# Altium integrated library Cap-Cer-SMD_V2.IntLib: 957 symbols (part 5 of 7) (continued)
## 68uF_1206N_10V_20%_X7R
designator C?, comment value 68uF  Voltage: 10V  Text1: 1206  (hidden comment: 68uF_C1206_10V_20%_X7R)
Cap Ceramic X7R; Manufacturer: Various; Part Number: 68uF 1206 10V 20% X7R; Tol: 20%; Package: CAPC1206X135N; EDM-PN: *; Text2: *; SAAB PN: *; DCE Part No: *
footprint CAPC1206X135N (Chip Capacitor, 1206, 2-Leads, Body 3.2x1.6mm, IPC Medium Density)
pins: 1, 2

## 75pF_0402N_50V_5%_C0G/NP0
designator C?, comment value 75pF  Voltage: 50V  Text1: 0402  (hidden comment: 75pF_C0402_50V_5%_C0G/NP0)
Cap Ceramic C0G/NP0; Manufacturer: Various; Part Number: 75pF 0402 50V 5% C0G/NP0; Tol: 5%; Package: CAPC0402X60N; EDM-PN: *; Text2: *; SAAB PN: *; DCE Part No: *
footprint CAPC0402X60N (Chip Capacitor, 0402, 2-Leads, Body 1.0x0.5mm, IPC Medium Density)
pins: 1, 2

## 82pF_0603N_50V_5%_C0G/NP0
designator C?, comment value 82pF  Voltage: 50V  Text1: 0603  (hidden comment: 82pF_C0603_50V_5%_C0G/NP0)
Cap Ceramic C0G/NP0; Manufacturer: Various; Part Number: 82pF 0603 50V 5% C0G/NP0; Tol: 5%; Package: CAPC0603X85N; EDM-PN: *; Text2: *; SAAB PN: *; DCE Part No: *
footprint CAPC0603X85N (Chip Capacitor, 0603, 2-Leads, Body 1.6x0.8mm, IPC Medium Density)
pins: 1, 2

## 82pF_0805N_50V_5%_C0G/NP0
designator C?, comment value 82pF  Voltage: 50V  Text1: 0805  (hidden comment: 82pF_C0805_50V_5%_C0G/NP0)
Cap Ceramic C0G/NP0; Manufacturer: Various; Part Number: 82pF 0805 50V 5% C0G/NP0; Tol: 5%; Package: CAPC0805X110N; EDM-PN: *; Text2: *; SAAB PN: *; DCE Part No: *
footprint CAPC0805X110N (Chip Capacitor, 0805, 2-Leads, Body 2.0x1.3mm, IPC Medium Density)
pins: 1, 2

## 82pF_1111N_500V_5%_P90
designator C?, comment value 82pF  Voltage: 500V  Text1: 1111  (hidden comment: 100B820JT500XT)
Cap Ceramic P90; Manufacturer: ATC; Tol: 5%; Part Number: 100B820JT500XT; Package: CAPC1111-100B-T; EDM-PN: *; Text2: *; SAAB PN: *; DCE Part No: *
footprint CAPC1111-100B-T (Capacitor, 1111 2.79x2.79mm)
pins: 1, 2

## 100nF_0201N_6.3V_10%_X5R
designator C?, comment value 100nF  Voltage: 6.3V  Text1: 0201  (hidden comment: 100nF_C0201_6.3V_10%_X5R)
Cap Ceramic X5R; Manufacturer: Various; Part Number: 100nF 0201 6.3V 10% X5R; Tol: 10%; Package: CAPC0201X33N; EDM-PN: *; Text2: *; SAAB PN: *; DCE Part No: *
footprint CAPC0201X33N (Chip Capacitor, 0201, 2-Leads, Body 0.6x0.3mm, IPC Medium Density)
pins: 1, 2

## 100nF_0201N_10V_10%_X5R
designator C?, comment value 100nF  Voltage: 10V  Text1: 0201  (hidden comment: 100nF_C0201_10V_10%_X5R)
Cap Ceramic X5R; Manufacturer: Various; Part Number: 100nF 0201 10V 10% X5R; Tol: 10%; Package: CAPC0201X33N; EDM-PN: *; Text2: *; SAAB PN: *; DCE Part No: *
footprint CAPC0201X33N (Chip Capacitor, 0201, 2-Leads, Body 0.6x0.3mm, IPC Medium Density)
pins: 1, 2

## 100nF_0201N_10V_10%_X7R
designator C?, comment value 100nF  Voltage: 10V  Text1: 0201  (hidden comment: 100nF_C0201_10V_10%_X7R)
Cap Ceramic X7R; Manufacturer: Various; Part Number: 100nF 0201 10V 10% X7R; Tol: 10%; Package: CAPC0201X33N; EDM-PN: *; Text2: *; SAAB PN: *; DCE Part No: *
footprint CAPC0201X33N (Chip Capacitor, 0201, 2-Leads, Body 0.6x0.3mm, IPC Medium Density)
pins: 1, 2

## 100nF_0201N_10V_20%_X5R
designator C?, comment value 100nF  Voltage: 10V  Text1: 0201  (hidden comment: 100nF_C0201_10V_20%_X5R)
Cap Ceramic X5R; Manufacturer: Various; Part Number: 100nF 0201 10V 20% X5R; Tol: 20%; Package: CAPC0201X33N; EDM-PN: *; Text2: *; SAAB PN: *; DCE Part No: *
footprint CAPC0201X33N (Chip Capacitor, 0201, 2-Leads, Body 0.6x0.3mm, IPC Medium Density)
pins: 1, 2

## 100nF_0204N_6.3V_20%_X7S
designator C?, comment value 100nF  Voltage: 6.3V  Text1: 0204  (hidden comment: 100nF_C0204_6.3V_20%_X7S)
Cap Ceramic X7S LGA Low Inductance; Manufacturer: AVX; Part Number: LG126Z104MAT2S1; Tol: 20%; Reutech PN: 5910-CC-0401; Package: CAPC0204-0.5; EDM-PN: *; Text2: *; SAAB PN: *; DCE Part No: *
footprint CAPC0204-0.5 (C0204 0.5x1.0mm)
pins: 1, 2

## 100nF_0402L_10V_10%_X7R
designator C?, comment value 100nF  Voltage: 10V  Text1: 0402  (hidden comment: 100nF_C0402_10V_10%_X7R)
Cap Ceramic X7R; Manufacturer: Various; Part Number: 100nF 0402 10V 10% X7R; Tol: 10%; Package: CAPC0402X60L; EDM-PN: *; Text2: *; SAAB PN: *; DCE Part No: *
footprint CAPC0402X60L (Chip Capacitor, 0402, 2-Leads, Body 1.0x0.5mm, IPC High Density)
pins: 1, 2

## 100nF_0402L_16V_10%_X7R
designator C?, comment value 100nF  Voltage: 16V  Text1: 0402  (hidden comment: 100nF_C0402_16V_10%_X7R)
Cap Ceramic X7R; Manufacturer: Various; Part Number: 100nF 0402 16V 10% X7R; EDM-PN: CAP496; Tol: 10%; Package: CAPC0402X60L; Text2: *; SAAB PN: *; DCE Part No: *
footprint CAPC0402X60L (Chip Capacitor, 0402, 2-Leads, Body 1.0x0.5mm, IPC High Density)
pins: 1, 2

## 100nF_0402L_16V_10%_X7R-DNF
designator C?, comment value (100nF)  Voltage: 16V  Text1: 0402  (hidden comment: 100nF_C0402_16V_10%_X7R-DNF)
Cap Ceramic X7R - Do not Fit; Manufacturer: Various; Part Number: DNF - 100nF 0402 16V 10% X7R; Tol: 10%; Package: CAPC0402X60L; EDM-PN: *; Text2: *; SAAB PN: *; DCE Part No: *
footprint CAPC0402X60L (Chip Capacitor, 0402, 2-Leads, Body 1.0x0.5mm, IPC High Density)
pins: 1, 2

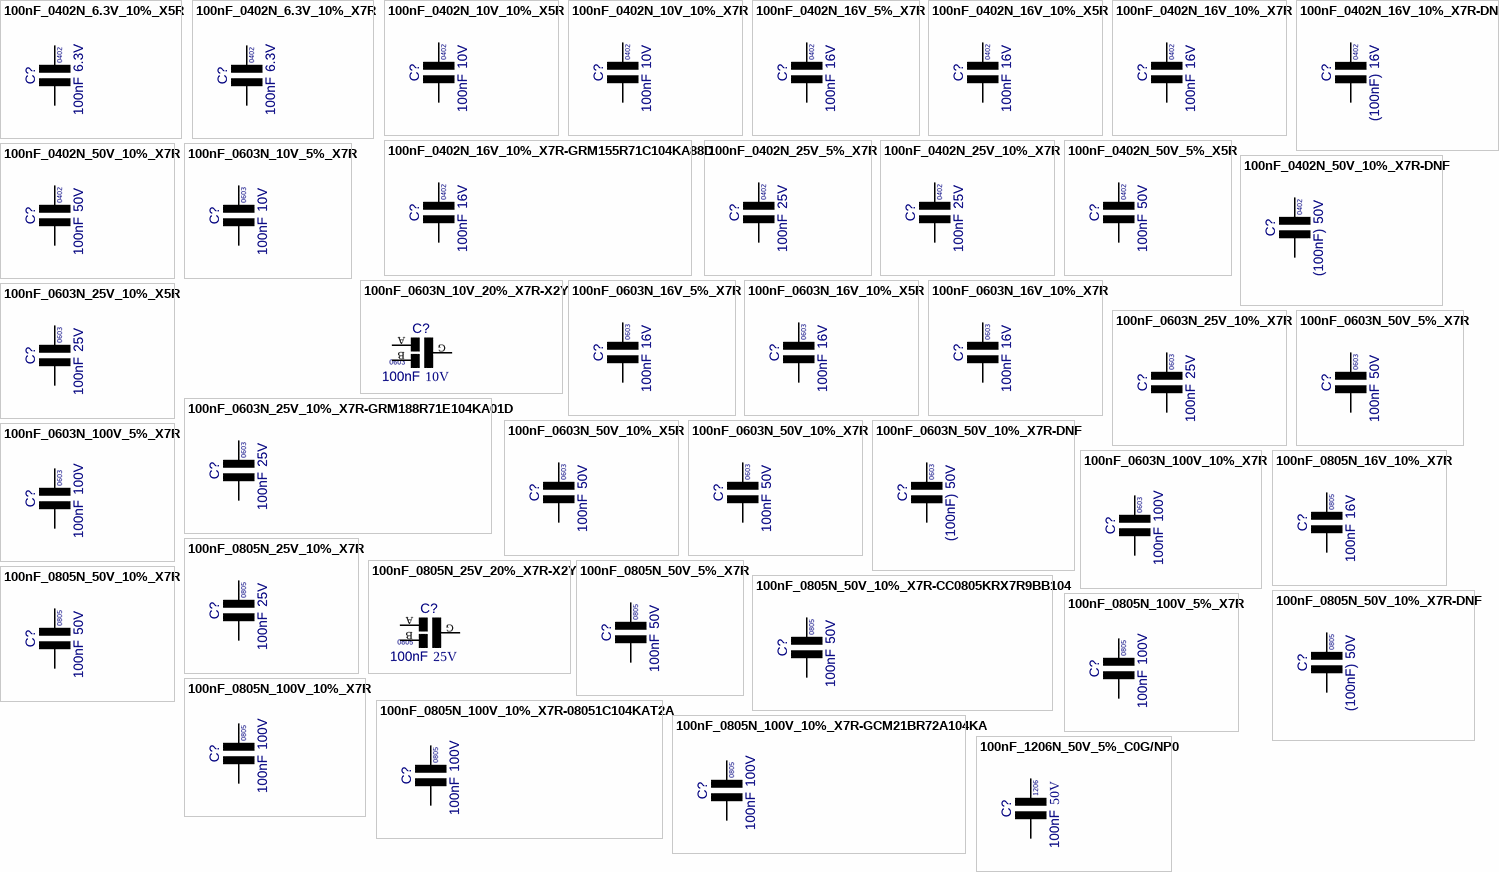
[diagram p17: symbols 100nF_0402N_6.3V_10%_X5R to 100nF_1206N_50V_5%_C0G/NP0]

## 100nF_0402N_6.3V_10%_X5R
designator C?, comment value 100nF  Voltage: 6.3V  Text1: 0402  (hidden comment: 100nF_C0402_6.3V_10%_X75R)
Cap Ceramic X5R; Manufacturer: Various; Part Number: 100nF 0402 6.3V 10% X5R; Tol: 10%; Package: CAPC0402X60N; EDM-PN: *; Text2: *; SAAB PN: *; DCE Part No: *
footprint CAPC0402X60N (Chip Capacitor, 0402, 2-Leads, Body 1.0x0.5mm, IPC Medium Density)
pins: 1, 2

## 100nF_0402N_6.3V_10%_X7R
designator C?, comment value 100nF  Voltage: 6.3V  Text1: 0402  (hidden comment: 100nF_C0402_6.3V_10%_X7R)
Cap Ceramic X7R; Manufacturer: Various; Part Number: 100nF 0402 6.3V 10% X7R; Tol: 10%; Package: CAPC0402X60N; EDM-PN: *; Text2: *; SAAB PN: *; DCE Part No: *
footprint CAPC0402X60N (Chip Capacitor, 0402, 2-Leads, Body 1.0x0.5mm, IPC Medium Density)
pins: 1, 2

## 100nF_0402N_10V_10%_X5R
designator C?, comment value 100nF  Voltage: 10V  Text1: 0402  (hidden comment: 100nF_C0402_10V_10%_X75R)
Cap Ceramic X5R; Manufacturer: Various; Part Number: 100nF 0402 10V 10% X5R; EDM-PN: CAP328; Tol: 10%; Package: CAPC0402X60N; Text2: *; SAAB PN: *; DCE Part No: *
footprint CAPC0402X60N (Chip Capacitor, 0402, 2-Leads, Body 1.0x0.5mm, IPC Medium Density)
pins: 1, 2

## 100nF_0402N_10V_10%_X7R
designator C?, comment value 100nF  Voltage: 10V  Text1: 0402  (hidden comment: 100nF_C0402_10V_10%_X7R)
Cap Ceramic X7R; Manufacturer: Various; Part Number: 100nF 0402 10V 10% X7R; EDM-PN: CAP428; Tol: 10%; Package: CAPC0402X60N; Text2: *; SAAB PN: *; DCE Part No: *
footprint CAPC0402X60N (Chip Capacitor, 0402, 2-Leads, Body 1.0x0.5mm, IPC Medium Density)
pins: 1, 2

## 100nF_0402N_16V_5%_X7R
designator C?, comment value 100nF  Voltage: 16V  Text1: 0402  (hidden comment: 100nF_C0402_16V_5%_X7R)
Cap Ceramic X7R; Manufacturer: Various; Part Number: 100nF 0402 16V 5% X7R; DCE Part No: 9744; Tol: 5%; Reutech PN: 5910-CA-0424; Package: CAPC0402X60N; EDM-PN: *; Text2: *; SAAB PN: *
footprint CAPC0402X60N (Chip Capacitor, 0402, 2-Leads, Body 1.0x0.5mm, IPC Medium Density)
pins: 1, 2

## 100nF_0402N_16V_10%_X5R
designator C?, comment value 100nF  Voltage: 16V  Text1: 0402  (hidden comment: 100nF_C0402_16V_10%_X5R)
Cap Ceramic X5R; Manufacturer: Various; Part Number: 100nF 0402 16V 10% X5R; Tol: 10%; Package: CAPC0402X60N; EDM-PN: *; Text2: *; SAAB PN: *; DCE Part No: *
footprint CAPC0402X60N (Chip Capacitor, 0402, 2-Leads, Body 1.0x0.5mm, IPC Medium Density)
pins: 1, 2

## 100nF_0402N_16V_10%_X7R
designator C?, comment value 100nF  Voltage: 16V  Text1: 0402  (hidden comment: 100nF_C0402_16V_10%_X7R)
Cap Ceramic X7R; Manufacturer: Various; Part Number: 100nF 0402 106V 10% X7R; EDM-PN: CAP496; Tol: 10%; Package: CAPC0402X60N; Text2: *; SAAB PN: *; DCE Part No: *
footprint CAPC0402X60N (Chip Capacitor, 0402, 2-Leads, Body 1.0x0.5mm, IPC Medium Density)
pins: 1, 2

## 100nF_0402N_16V_10%_X7R-DNF
designator C?, comment value (100nF)  Voltage: 16V  Text1: 0402  (hidden comment: 100nF_C0402_16V_10%_X7R-DNF)
Cap Ceramic X7R - Do not Fit; Manufacturer: Various; Part Number: DNF - 100nF 0402 16V 10% X7R; Tol: 10%; Package: CAPC0402X60N; EDM-PN: *; Text2: *; SAAB PN: *; DCE Part No: *
footprint CAPC0402X60N (Chip Capacitor, 0402, 2-Leads, Body 1.0x0.5mm, IPC Medium Density)
pins: 1, 2

## 100nF_0402N_16V_10%_X7R-GRM155R71C104KA88D
designator C?, comment value 100nF  Voltage: 16V  Text1: 0402  (hidden comment: GRM155R71C104KA88D)
Cap Ceramic X7R; Manufacturer: Murata; Tol: 10%; Part Number: GRM155R71C104KA88D; Package: CAPC0402X60N; EDM-PN: *; Text2: *; SAAB PN: *; DCE Part No: *
footprint CAPC0402X60N (Chip Capacitor, 0402, 2-Leads, Body 1.0x0.5mm, IPC Medium Density)
pins: 1, 2

## 100nF_0402N_25V_5%_X7R
designator C?, comment value 100nF  Voltage: 25V  Text1: 0402  (hidden comment: 100nF_C0402_25V_5%_X7R)
Cap Ceramic X7R; Manufacturer: Various; Part Number: 100nF 0402 25V 5% X7R; EDM-PN: CAP939; Tol: 5%; SAAB PN: 1AAB00439AEA; Package: CAPC0402X60N; Text2: *; DCE Part No: *
footprint CAPC0402X60N (Chip Capacitor, 0402, 2-Leads, Body 1.0x0.5mm, IPC Medium Density)
pins: 1, 2

## 100nF_0402N_25V_10%_X7R
designator C?, comment value 100nF  Voltage: 25V  Text1: 0402  (hidden comment: 100nF_C0402_25V_10%_X7R)
Cap Ceramic X7R; Manufacturer: Various; Part Number: 100nF 0402 25V 10% X7R; Tol: 10%; Package: CAPC0402X60N; EDM-PN: *; Text2: *; SAAB PN: *; DCE Part No: *
footprint CAPC0402X60N (Chip Capacitor, 0402, 2-Leads, Body 1.0x0.5mm, IPC Medium Density)
pins: 1, 2

## 100nF_0402N_50V_5%_X5R
designator C?, comment value 100nF  Voltage: 50V  Text1: 0402  (hidden comment: 100nF_C0402_50V_5%_X5R)
Cap Ceramic X5R; Manufacturer: Various; Part Number: 100nF 0402 50V 5% X5R; Tol: 5%; Package: CAPC0402X60N; EDM-PN: *; Text2: *; SAAB PN: *; DCE Part No: *
footprint CAPC0402X60N (Chip Capacitor, 0402, 2-Leads, Body 1.0x0.5mm, IPC Medium Density)
pins: 1, 2

## 100nF_0402N_50V_10%_X7R
designator C?, comment value 100nF  Voltage: 50V  Text1: 0402  (hidden comment: 100nF_C0402_50V_10%_X7R)
Cap Ceramic X7R; Manufacturer: Various; Part Number: 100nF 0402 50V 10% X7R; EDM-PN: CAP712; Tol: 10%; Package: CAPC0402X60N; Text2: *; SAAB PN: *; DCE Part No: *
footprint CAPC0402X60N (Chip Capacitor, 0402, 2-Leads, Body 1.0x0.5mm, IPC Medium Density)
pins: 1, 2

## 100nF_0402N_50V_10%_X7R-DNF
designator C?, comment value (100nF)  Voltage: 50V  Text1: 0402  (hidden comment: 100nF_C0402_50V_10%_X7R)
Cap Ceramic X7R - Do not Fit; Manufacturer: Various; Part Number: DNF - 100nF 0402 50V 10% X7R; Tol: 10%; Package: CAPC0402X60N; EDM-PN: *; Text2: *; SAAB PN: *; DCE Part No: *
footprint CAPC0402X60N (Chip Capacitor, 0402, 2-Leads, Body 1.0x0.5mm, IPC Medium Density)
pins: 1, 2

## 100nF_0603N_10V_5%_X7R
designator C?, comment value 100nF  Voltage: 10V  Text1: 0603  (hidden comment: 100nF_C0603_10V_5%_X7R)
Cap Ceramic X7R; Manufacturer: Various; Part Number: 100nF 0603 10V 5% X7R; Tol: 5%; Package: CAPC0603X85N; EDM-PN: *; Text2: *; Reutech PN: *; SAAB PN: *; DCE Part No: *
footprint CAPC0603X85N (Chip Capacitor, 0603, 2-Leads, Body 1.6x0.8mm, IPC Medium Density)
pins: 1, 2

## 100nF_0603N_10V_20%_X7R-X2Y
designator C?, comment value 100nF  Voltage: 10V  Text1: 0603  (hidden comment: X2Y-100nF_C0603_10V_20%_X7R)
Cap Ceramic X2Y; Manufacturer: Johanson; Part Number: 100X14W104MV4T; Tol: 20%; Package: CAPC0603-X2Y; EDM-PN: *; Text2: *; SAAB PN: *; DCE Part No: *
footprint CAPC0603-X2Y (Cap 0603 X2Y 1.6x0.89mm)
pins: A, B, G

## 100nF_0603N_16V_5%_X7R
designator C?, comment value 100nF  Voltage: 16V  Text1: 0603  (hidden comment: 100nF_C0603_16V_5%_X7R)
Cap Ceramic X7R; Manufacturer: Various; Part Number: 100nF 0603 16V 5% X7R; EDM-PN: CAP658; Tol: 5%; Reutech PN: 5910-CA-0555; Package: CAPC0603X85N; Text2: *; SAAB PN: *; DCE Part No: *
footprint CAPC0603X85N (Chip Capacitor, 0603, 2-Leads, Body 1.6x0.8mm, IPC Medium Density)
pins: 1, 2

## 100nF_0603N_16V_10%_X5R
designator C?, comment value 100nF  Voltage: 16V  Text1: 0603  (hidden comment: 100nF_C0603_16V_10%_X5R)
Cap Ceramic X5R; Manufacturer: Various; Part Number: 100nF 0603 16V 10% X5R; EDM-PN: CAP303; Tol: 10%; Package: CAPC0603X85N; Text2: *; SAAB PN: *; DCE Part No: *
footprint CAPC0603X85N (Chip Capacitor, 0603, 2-Leads, Body 1.6x0.8mm, IPC Medium Density)
pins: 1, 2

## 100nF_0603N_16V_10%_X7R
designator C?, comment value 100nF  Voltage: 16V  Text1: 0603  (hidden comment: 100nF_C0603_16V_10%_X7R)
Cap Ceramic X7R; Manufacturer: Various; Part Number: 100nF 0603 16V 10% X7R; EDM-PN: CAP303; Tol: 10%; Reutech PN: 5910-CA-0544; Package: CAPC0603X85N; Text2: *; SAAB PN: *; DCE Part No: *
footprint CAPC0603X85N (Chip Capacitor, 0603, 2-Leads, Body 1.6x0.8mm, IPC Medium Density)
pins: 1, 2

## 100nF_0603N_25V_10%_X5R
designator C?, comment value 100nF  Voltage: 25V  Text1: 0603  (hidden comment: 100nF_C0603_25V_10%_X5R)
Cap Ceramic X5R; Manufacturer: Various; Part Number: 100nF 0603 25V 10% X5R; EDM-PN: CAP304; Tol: 10%; Reutech PN: 5910-CA-0403; Package: CAPC0603X85N; Text2: *; SAAB PN: *; DCE Part No: *
footprint CAPC0603X85N (Chip Capacitor, 0603, 2-Leads, Body 1.6x0.8mm, IPC Medium Density)
pins: 1, 2

## 100nF_0603N_25V_10%_X7R
designator C?, comment value 100nF  Voltage: 25V  Text1: 0603  (hidden comment: 100nF_C0603_25V_10%_X7R)
Cap Ceramic X7R; Manufacturer: Various; Part Number: 100nF 0603 25V 10% X7R; Tol: 10%; Package: CAPC0603X85N; EDM-PN: *; Text2: *; Reutech PN: *; SAAB PN: *; DCE Part No: *
footprint CAPC0603X85N (Chip Capacitor, 0603, 2-Leads, Body 1.6x0.8mm, IPC Medium Density)
pins: 1, 2

## 100nF_0603N_25V_10%_X7R-GRM188R71E104KA01D
designator C?, comment value 100nF  Voltage: 25V  Text1: 0603  (hidden comment: GRM188R71E104KA01D)
Cap Ceramic X7R; Manufacturer: Murata; Tol: 10%; Part Number: GRM188R71E104KA01D; Package: CAPC0603X85N; EDM-PN: *; Text2: *; Reutech PN: *; SAAB PN: *; DCE Part No: *
footprint CAPC0603X85N (Chip Capacitor, 0603, 2-Leads, Body 1.6x0.8mm, IPC Medium Density)
pins: 1, 2

## 100nF_0603N_50V_5%_X7R
designator C?, comment value 100nF  Voltage: 50V  Text1: 0603  (hidden comment: 100nF_C0603_50V_5%_X7R)
Cap Ceramic X7R; Manufacturer: Various; Part Number: 100nF 0603 50V 5% X7R; EDM-PN: CAP658; Tol: 5%; Reutech PN: 5910-CA-0433; Package: CAPC0603X85N; Text2: *; SAAB PN: *; DCE Part No: *
footprint CAPC0603X85N (Chip Capacitor, 0603, 2-Leads, Body 1.6x0.8mm, IPC Medium Density)
pins: 1, 2

## 100nF_0603N_50V_10%_X5R
designator C?, comment value 100nF  Voltage: 50V  Text1: 0603  (hidden comment: 100nF_C0603_50V_10%_X5R)
Cap Ceramic X5R; Manufacturer: Various; Part Number: 100nF 0603 50V 10% X5R; EDM-PN: CAP111; Tol: 10%; Package: CAPC0603X85N; Text2: *; SAAB PN: *; DCE Part No: *
footprint CAPC0603X85N (Chip Capacitor, 0603, 2-Leads, Body 1.6x0.8mm, IPC Medium Density)
pins: 1, 2

## 100nF_0603N_50V_10%_X7R
designator C?, comment value 100nF  Voltage: 50V  Text1: 0603  (hidden comment: 100nF_C0603_50V_10%_X7R)
Cap Ceramic X7R; Manufacturer: Various; Part Number: 100nF 0603 50V 10% X7R; EDM-PN: CAP111; Tol: 10%; Reutech PN: 5910-CA-0421; Package: CAPC0603X85N; Text2: *; SAAB PN: *; DCE Part No: *
footprint CAPC0603X85N (Chip Capacitor, 0603, 2-Leads, Body 1.6x0.8mm, IPC Medium Density)
pins: 1, 2

## 100nF_0603N_50V_10%_X7R-DNF
designator C?, comment value (100nF)  Voltage: 50V  Text1: 0603  (hidden comment: 100nF_C0603_50V_10%_X7R-DNF)
Cap Ceramic X7R - Do not fit; Manufacturer: Various; Part Number: DNF - 100nF 0603 50V 10% X7R; Tol: 10%; Reutech PN: 5910-CA-0421; Package: CAPC0603X85N; EDM-PN: *; Text2: *; SAAB PN: *; DCE Part No: *
footprint CAPC0603X85N (Chip Capacitor, 0603, 2-Leads, Body 1.6x0.8mm, IPC Medium Density)
pins: 1, 2

## 100nF_0603N_100V_5%_X7R
designator C?, comment value 100nF  Voltage: 100V  Text1: 0603  (hidden comment: 100nF_C0603_100V_5%_X7R)
Cap Ceramic X7R; Manufacturer: Various; Part Number: 100nF 0603 100V 5% X7R; Tol: 5%; Package: CAPC0603X85N; EDM-PN: *; Text2: *; Reutech PN: *; SAAB PN: *; DCE Part No: *
footprint CAPC0603X85N (Chip Capacitor, 0603, 2-Leads, Body 1.6x0.8mm, IPC Medium Density)
pins: 1, 2

## 100nF_0603N_100V_10%_X7R
designator C?, comment value 100nF  Voltage: 100V  Text1: 0603  (hidden comment: 100nF_C0603_100V_10%_X7R)
Cap Ceramic X7R; Manufacturer: Various; Part Number: 100nF 0603 100V 10% X7R; EDM-PN: CAP111; Tol: 10%; Package: CAPC0603X85N; Text2: *; SAAB PN: *; DCE Part No: *
footprint CAPC0603X85N (Chip Capacitor, 0603, 2-Leads, Body 1.6x0.8mm, IPC Medium Density)
pins: 1, 2

## 100nF_0805N_16V_10%_X7R
designator C?, comment value 100nF  Voltage: 16V  Text1: 0805  (hidden comment: 100nF_C0805_16V_10%_X7R)
Cap Ceramic X7R; Manufacturer: Various; Part Number: 100nF 0805 16V 10% X7R; Tol: 10%; Package: CAPC0805X110N; EDM-PN: *; Text2: *; SAAB PN: *; DCE Part No: *
footprint CAPC0805X110N (Chip Capacitor, 0805, 2-Leads, Body 2.0x1.3mm, IPC Medium Density)
pins: 1, 2

## 100nF_0805N_25V_10%_X7R
designator C?, comment value 100nF  Voltage: 25V  Text1: 0805  (hidden comment: 100nF_C0805_25V_10%_X7R)
Cap Ceramic X7R; Manufacturer: Various; Part Number: 100nF 0805 25V 10% X7R; EDM-PN: CAP42; Tol: 10%; Package: CAPC0805X110N; Text2: *; SAAB PN: *; DCE Part No: *
footprint CAPC0805X110N (Chip Capacitor, 0805, 2-Leads, Body 2.0x1.3mm, IPC Medium Density)
pins: 1, 2

## 100nF_0805N_25V_20%_X7R-X2Y
designator C?, comment value 100nF  Voltage: 25V  Text1: 0805  (hidden comment: X2Y-100nF_C0805_25V_20%_X7R)
Cap Ceramic X2Y; Manufacturer: Johanson; Part Number: 250X15W104MV4E; Tol: 20%; Package: CAPC0805-X2Y; EDM-PN: *; Text2: *; SAAB PN: *; DCE Part No: *
footprint CAPC0805-X2Y (Cap 0805 X2Y 2.0x1.27mm)
pins: A, B, G

## 100nF_0805N_50V_5%_X7R
designator C?, comment value 100nF  Voltage: 50V  Text1: 0805  (hidden comment: 100nF_C0805_50V_5%_X7R)
Cap Ceramic X7R; Manufacturer: Various; Part Number: 100nF 0805 50V 5% X7R; EDM-PN: CAP1002; Tol: 5%; SAAB PN: 1AAB00222AEA; Package: CAPC0805X110N; Text2: *; DCE Part No: *
footprint CAPC0805X110N (Chip Capacitor, 0805, 2-Leads, Body 2.0x1.3mm, IPC Medium Density)
pins: 1, 2

## 100nF_0805N_50V_10%_X7R
designator C?, comment value 100nF  Voltage: 50V  Text1: 0805  (hidden comment: 100nF_C0805_50V_10%_X7R)
Cap Ceramic X7R; Manufacturer: Various; Part Number: 100nF 0805 50V 10% X7R; EDM-PN: CAP42; Tol: 10%; Reutech PN: 5910-CA-0122; Package: CAPC0805X110N; Text2: *; SAAB PN: *; DCE Part No: *
footprint CAPC0805X110N (Chip Capacitor, 0805, 2-Leads, Body 2.0x1.3mm, IPC Medium Density)
pins: 1, 2

## 100nF_0805N_50V_10%_X7R-CC0805KRX7R9BB104
designator C?, comment value 100nF  Voltage: 50V  Text1: 0805  (hidden comment: 100nF_C0805_50V_10%_X7R)
Cap Ceramic X7R; Manufacturer: Yageo; Part Number: CC0805KRX7R9BB104; Tol: 10%; Package: CAPC0805X110N; Text2: *; SAAB PN: *; DCE Part No: *
footprint CAPC0805X110N (Chip Capacitor, 0805, 2-Leads, Body 2.0x1.3mm, IPC Medium Density)
pins: 1, 2

## 100nF_0805N_50V_10%_X7R-DNF
designator C?, comment value (100nF)  Voltage: 50V  Text1: 0805  (hidden comment: 100nF[NEQ]_C0805_50V_10%_X7R)
Cap Ceramic X7R - Do not Fit; Manufacturer: Various; Part Number: DNF - 100nF 0805 50V 10% X7R; Tol: 10%; Package: CAPC0805X110N; EDM-PN: *; Text2: *; SAAB PN: *; DCE Part No: *
footprint CAPC0805X110N (Chip Capacitor, 0805, 2-Leads, Body 2.0x1.3mm, IPC Medium Density)
pins: 1, 2

## 100nF_0805N_100V_5%_X7R
designator C?, comment value 100nF  Voltage: 100V  Text1: 0805  (hidden comment: 100nF_C0805_100V_5%_X7R)
Cap Ceramic X7R; Manufacturer: Various; Part Number: 100nF 0805 100V 5% X7R; Tol: 5%; Reutech PN: 5910-CA-0563; Package: CAPC0805X110N; EDM-PN: *; Text2: *; SAAB PN: *; DCE Part No: *
footprint CAPC0805X110N (Chip Capacitor, 0805, 2-Leads, Body 2.0x1.3mm, IPC Medium Density)
pins: 1, 2

## 100nF_0805N_100V_10%_X7R
designator C?, comment value 100nF  Voltage: 100V  Text1: 0805  (hidden comment: 100nF_C0805_100V_10%_X7R)
Cap Ceramic X7R; Manufacturer: Various; Part Number: 100nF 0805 100V 10% X7R; EDM-PN: CAP824; Tol: 10%; SAAB PN: 1AAB00464AEA; Package: CAPC0805X135N; Text2: *; DCE Part No: *
footprint CAPC0805X135N (Chip Capacitor, 0805, 2-Leads, Body 2.0x1.3mm, IPC Medium Density)
pins: 1, 2

## 100nF_0805N_100V_10%_X7R-08051C104KAT2A
designator C?, comment value 100nF  Voltage: 100V  Text1: 0805  (hidden comment: 08051C104KAT2A)
Cap Ceramic X7R; Manufacturer: AVX; Tol: 10%; Part Number: 08051C104KAT2A; Package: CAPC0805X135N; EDM-PN: *; Text2: *; SAAB PN: *; DCE Part No: *
footprint CAPC0805X135N (Chip Capacitor, 0805, 2-Leads, Body 2.0x1.3mm, IPC Medium Density)
pins: 1, 2

## 100nF_0805N_100V_10%_X7R-GCM21BR72A104KA
designator C?, comment value 100nF  Voltage: 100V  Text1: 0805  (hidden comment: GCM21BR72A104KA)
Cap Ceramic X7R; Manufacturer: Murata; Tol: 10%; Part Number: GCM21BR72A104KA; Package: CAPC0805X135N; EDM-PN: *; Text2: *; SAAB PN: *; DCE Part No: *
footprint CAPC0805X135N (Chip Capacitor, 0805, 2-Leads, Body 2.0x1.3mm, IPC Medium Density)
pins: 1, 2

## 100nF_1206N_50V_5%_C0G/NP0
designator C?, comment value 100nF  Voltage: 50V  Text1: 1206  (hidden comment: 100nF_C1206_50V_5%_C0G/NP0)
Cap Ceramic C0G/NP0; Manufacturer: Various; Part Number: 100nF 1206 50V 5% C0G/NP0; Tol: 5%; Package: CAPC1206X135N; EDM-PN: *; Text2: *; SAAB PN: *; DCE Part No: *
footprint CAPC1206X135N (Chip Capacitor, 1206, 2-Leads, Body 3.2x1.6mm, IPC Medium Density)
pins: 1, 2

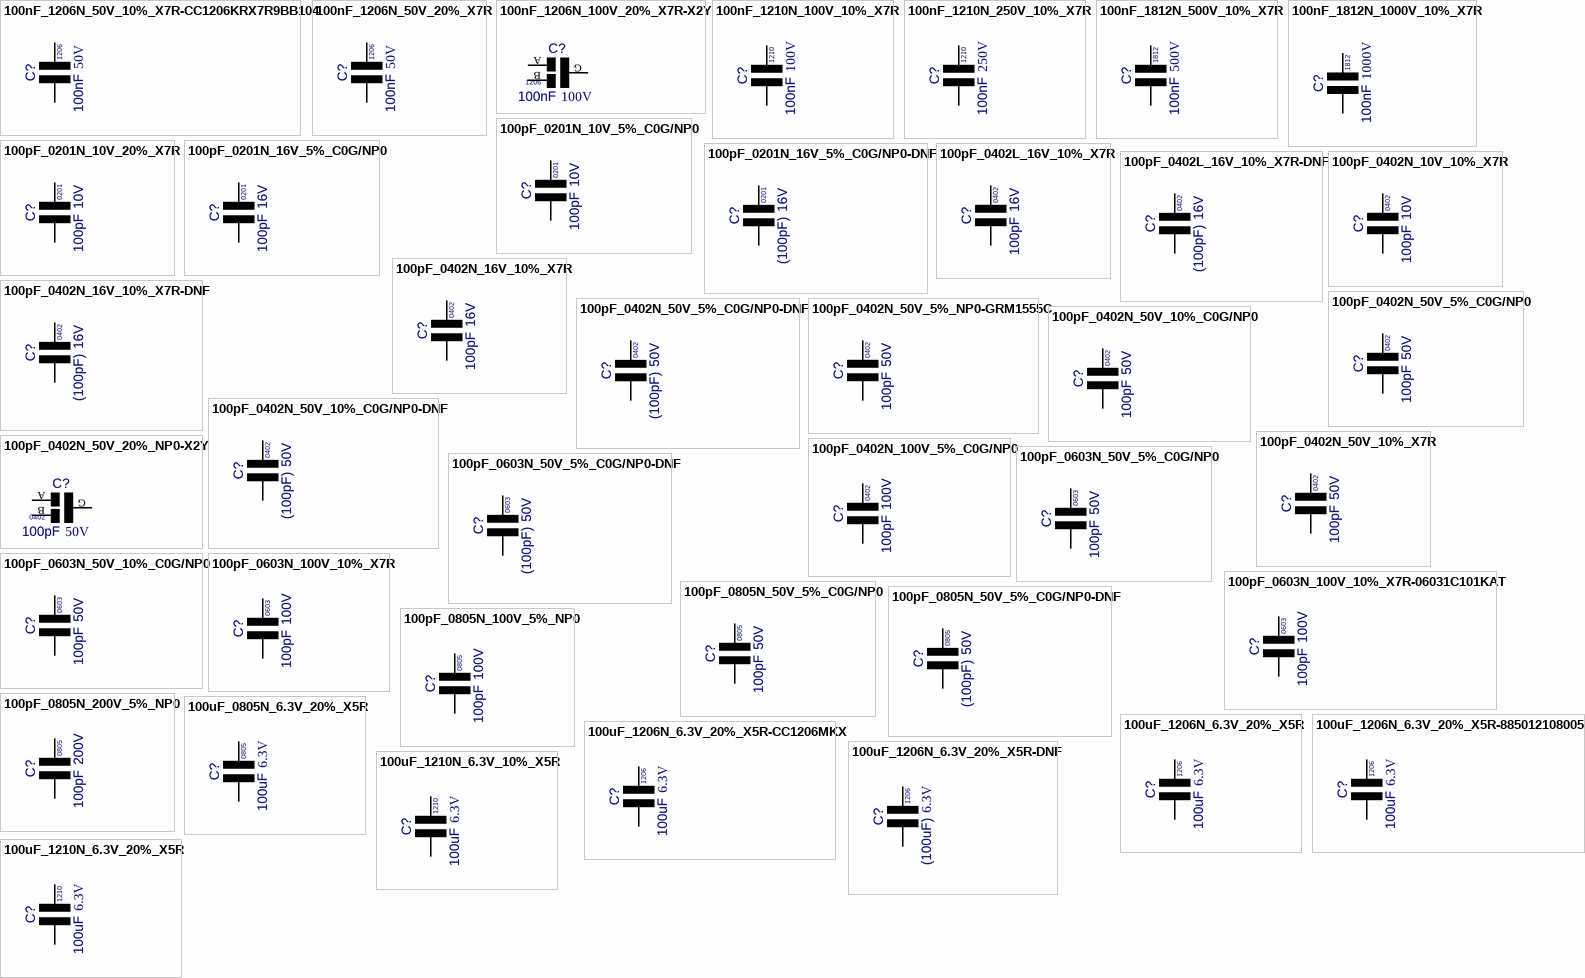
[diagram p18: symbols 100nF_1206N_50V_10%_X7R-CC1206KRX7R9BB104 to 100uF_1210N_6.3V_20%_X5R]

## 100nF_1206N_50V_10%_X7R-CC1206KRX7R9BB104
designator C?, comment value 100nF  Voltage: 50V  Text1: 1206  (hidden comment: 100nF_C1206_50V_10%_X7R)
Cap Ceramic X7R; Manufacturer: Yageo; Part Number: CC1206KRX7R9BB104; Tol: 10%; Package: CAPC1206X135N; EDM-PN: *; Text2: *; SAAB PN: *; DCE Part No: *
footprint CAPC1206X135N (Chip Capacitor, 1206, 2-Leads, Body 3.2x1.6mm, IPC Medium Density)
pins: 1, 2

## 100nF_1206N_50V_20%_X7R
designator C?, comment value 100nF  Voltage: 50V  Text1: 1206  (hidden comment: 100nF_C1206_50V_20%_X7R)
Cap Ceramic X7R; Manufacturer: Various; Part Number: 100nF 1206 50V 20% X7R; Tol: 20%; Package: CAPC1206X135N; EDM-PN: *; Text2: *; SAAB PN: *; DCE Part No: *
footprint CAPC1206X135N (Chip Capacitor, 1206, 2-Leads, Body 3.2x1.6mm, IPC Medium Density)
pins: 1, 2

## 100nF_1206N_100V_20%_X7R-X2Y
designator C?, comment value 100nF  Voltage: 100V  Text1: 1206  (hidden comment: X2Y-100nF_C1206_100V_20%_X7R)
Cap Ceramic X2Y; Manufacturer: Johanson; Part Number: 101X18W104MV4E; Tol: 20%; Package: CAPC1206-X2Y; EDM-PN: *; Text2: *; SAAB PN: *; DCE Part No: *
footprint CAPC1206-X2Y (Cap 1206 X2Y 3.1x1.6mm)
pins: A, B, G

## 100nF_1210N_100V_10%_X7R
designator C?, comment value 100nF  Voltage: 100V  Text1: 1210  (hidden comment: 100nF_C1210_100V_10%_X7R)
Cap Ceramic X7R; Manufacturer: Various; Part Number: 100nF 1210 100V 10% X7R; Tol: 10%; Reutech PN: 5910-CA-0559; Package: CAPC1210X135N; EDM-PN: *; Text2: *; SAAB PN: *; DCE Part No: *
footprint CAPC1210X135N (Chip Capacitor, 1210, 2-Leads, Body 3.2x2.5mm, IPC Medium Density)
pins: 1, 2

## 100nF_1210N_250V_10%_X7R
designator C?, comment value 100nF  Voltage: 250V  Text1: 1210  (hidden comment: 100nF_C1210_250V_10%_X7R)
Cap Ceramic X7R; Manufacturer: Various; Part Number: 100nF 1210 250V 10% X7R; Tol: 10%; Package: CAPC1210X135N; EDM-PN: *; Text2: *; Reutech PN: *; SAAB PN: *; DCE Part No: *
footprint CAPC1210X135N (Chip Capacitor, 1210, 2-Leads, Body 3.2x2.5mm, IPC Medium Density)
pins: 1, 2

## 100nF_1812N_500V_10%_X7R
designator C?, comment value 100nF  Voltage: 500V  Text1: 1812  (hidden comment: 100nF_C1812_500V_10%_X7R)
Cap Ceramic X7R; Manufacturer: Various; Part Number: 100nF 1812 500V 10% X7R; Tol: 10%; Package: CAPC1812X190N; EDM-PN: *; Text2: *; SAAB PN: *; DCE Part No: *
footprint CAPC1812X190N (Chip Capacitor, 1812, 2-Leads, Body 4.5x3.2mm, IPC Medium Density)
pins: 1, 2

## 100nF_1812N_1000V_10%_X7R
designator C?, comment value 100nF  Voltage: 1000V  Text1: 1812  (hidden comment: 100nF_C1812_1000V_10%_X7R)
Cap Ceramic X7R; Manufacturer: Various; Part Number: 100nF 1812 1000V 10% X7R; Tol: 10%; Package: CAPC1812X190N; EDM-PN: *; Text2: *; SAAB PN: *; DCE Part No: *
footprint CAPC1812X190N (Chip Capacitor, 1812, 2-Leads, Body 4.5x3.2mm, IPC Medium Density)
pins: 1, 2

## 100pF_0201N_10V_5%_C0G/NP0
designator C?  value 100pF  Voltage: 10V  Text1: 0201  (hidden comment: 100pF_0201N_10V_5%_C0G/NP0)
Cap Ceramic C0G/NP0; Manufacturer: Various; Part Number: 100pF 0201 10V 5% C0G/NP0; Tol: 5%; Package: CAPC0201X33N; EDM-PN: *; Text2: *; SAAB PN: *; DCE Part No: *
footprint CAPC0201X33N (Chip Capacitor, 0201, 2-Leads, Body 0.6x0.3mm, IPC Medium Density)
pins: 1, 2

## 100pF_0201N_10V_20%_X7R
designator C?  value 100pF  Voltage: 10V  Text1: 0201  (hidden comment: 100pF_0201N_10V_20%_X7R)
Cap Ceramic X7R; Manufacturer: Various; Part Number: 100pF 0201 10V 10% X7R; Tol: 20%; Package: CAPC0201X33N; EDM-PN: *; Text2: *; SAAB PN: *; DCE Part No: *
footprint CAPC0201X33N (Chip Capacitor, 0201, 2-Leads, Body 0.6x0.3mm, IPC Medium Density)
pins: 1, 2

## 100pF_0201N_16V_5%_C0G/NP0
designator C?  value 100pF  Voltage: 16V  Text1: 0201  (hidden comment: 100pF_0201N_16V_5%_C0G/NP0)
Cap Ceramic C0G/NP0; Manufacturer: Various; Part Number: 100pF 0201 16V 5% C0G/NP0; Tol: 5%; Package: CAPC0201X33N; EDM-PN: *; Text2: *; SAAB PN: *; DCE Part No: *
footprint CAPC0201X33N (Chip Capacitor, 0201, 2-Leads, Body 0.6x0.3mm, IPC Medium Density)
pins: 1, 2

## 100pF_0201N_16V_5%_C0G/NP0-DNF
designator C?, comment value (100pF)  Voltage: 16V  Text1: 0201  (hidden comment: 100pF_0201N_16V_5%_C0G/NP0)
Cap Ceramic C0G/NP0 - Do not Fit; Manufacturer: Various; Part Number: DNF - 100pF 0201 16V 5% C0G/NP0; Tol: 5%; Package: CAPC0201X33N; EDM-PN: *; Text2: *; SAAB PN: *; DCE Part No: *
footprint CAPC0201X33N (Chip Capacitor, 0201, 2-Leads, Body 0.6x0.3mm, IPC Medium Density)
pins: 1, 2

## 100pF_0402L_16V_10%_X7R
designator C?, comment value 100pF  Voltage: 16V  Text1: 0402  (hidden comment: 100pF_C0402_16V_10%_X7R)
Cap Ceramic X7R; Manufacturer: Various; Part Number: 100pF 0402 16V 10% X7R; EDM-PN: CAP802; Tol: 10%; Package: CAPC0402X60L; Text2: *; SAAB PN: *; DCE Part No: *
footprint CAPC0402X60L (Chip Capacitor, 0402, 2-Leads, Body 1.0x0.5mm, IPC High Density)
pins: 1, 2

## 100pF_0402L_16V_10%_X7R-DNF
designator C?, comment value (100pF)  Voltage: 16V  Text1: 0402  (hidden comment: 100pF_C0402_16V_10%_X7R)
Cap Ceramic X7R - Do not Fit; Manufacturer: Various; Part Number: DNF - 100pF 0402 16V 10% X7R; EDM-PN: CAP802; Tol: 10%; Package: CAPC0402X60L; Text2: *; SAAB PN: *; DCE Part No: *
footprint CAPC0402X60L (Chip Capacitor, 0402, 2-Leads, Body 1.0x0.5mm, IPC High Density)
pins: 1, 2

## 100pF_0402N_10V_10%_X7R
designator C?, comment value 100pF  Voltage: 10V  Text1: 0402  (hidden comment: 100pF_C0402_10V_10%_X7R)
Cap Ceramic X7R; Manufacturer: Various; Part Number: 100pF 0402 10V 10% X7R; Tol: 10%; Package: CAPC0402X60N; EDM-PN: *; Text2: *; SAAB PN: *; DCE Part No: *
footprint CAPC0402X60N (Chip Capacitor, 0402, 2-Leads, Body 1.0x0.5mm, IPC Medium Density)
pins: 1, 2

## 100pF_0402N_16V_10%_X7R
designator C?, comment value 100pF  Voltage: 16V  Text1: 0402  (hidden comment: 100pF_C0402_16V_10%_X7R)
Cap Ceramic X7R; Manufacturer: Various; Part Number: 100pF 0402 16V 10% X7R; EDM-PN: CAP802; Tol: 10%; Package: CAPC0402X60N; Text2: *; SAAB PN: *; DCE Part No: *
footprint CAPC0402X60N (Chip Capacitor, 0402, 2-Leads, Body 1.0x0.5mm, IPC Medium Density)
pins: 1, 2

## 100pF_0402N_16V_10%_X7R-DNF
designator C?, comment value (100pF)  Voltage: 16V  Text1: 0402  (hidden comment: 100pF_C0402_16V_10%_X7R)
Cap Ceramic X7R - Do not Fit; Manufacturer: Various; Part Number: DNF - 100pF 0402 16V 10% X7R; EDM-PN: CAP802; Tol: 10%; Package: CAPC0402X60N; Text2: *; SAAB PN: *; DCE Part No: *
footprint CAPC0402X60N (Chip Capacitor, 0402, 2-Leads, Body 1.0x0.5mm, IPC Medium Density)
pins: 1, 2

## 100pF_0402N_50V_5%_C0G/NP0
designator C?, comment value 100pF  Voltage: 50V  Text1: 0402  (hidden comment: 100pF_C0402_50V_5%_C0G/NP0)
Cap Ceramic C0G/NP0; Manufacturer: Various; Part Number: 100pF 0402 50V 5% C0G/NP0; DCE Part No: 9732; Tol: 5%; Package: CAPC0402X60N; EDM-PN: *; Text2: *; SAAB PN: *
footprint CAPC0402X60N (Chip Capacitor, 0402, 2-Leads, Body 1.0x0.5mm, IPC Medium Density)
pins: 1, 2

## 100pF_0402N_50V_5%_C0G/NP0-DNF
designator C?, comment value (100pF)  Voltage: 50V  Text1: 0402  (hidden comment: 100pF_C0402_50V_5%_C0G/NP0-DNF)
Cap Ceramic C0G/NP0 - Do not Fit; Manufacturer: Various; Part Number: DNF - 100pF 0402 50V 5% C0G/NP0; Tol: 5%; Package: CAPC0402X60N; EDM-PN: *; Text2: *; SAAB PN: *; DCE Part No: *
footprint CAPC0402X60N (Chip Capacitor, 0402, 2-Leads, Body 1.0x0.5mm, IPC Medium Density)
pins: 1, 2

## 100pF_0402N_50V_5%_NP0-GRM1555C
designator C?, comment value 100pF  Voltage: 50V  Text1: 0402  (hidden comment: GRM1555C1H101JA01D)
Cap Ceramic NP0; Manufacturer: Murata; Tol: 5%; Part Number: GRM1555C1H101JA01D; Package: GRM155-0.20; EDM-PN: *; Text2: *; SAAB PN: *; DCE Part No: *
footprint GRM155-0.20 (GRM155 0402 1.0x0.5mm)
pins: 1, 2

## 100pF_0402N_50V_10%_C0G/NP0
designator C?, comment value 100pF  Voltage: 50V  Text1: 0402  (hidden comment: 100pF_C0402_50V_10%_C0G/NP0)
Cap Ceramic C0G/NP0; Manufacturer: Various; Part Number: 100pF 0402 50V 10% C0G/NP0; EDM-PN: CAP802; Tol: 10%; Package: CAPC0402X60N; Text2: *; SAAB PN: *; DCE Part No: *
footprint CAPC0402X60N (Chip Capacitor, 0402, 2-Leads, Body 1.0x0.5mm, IPC Medium Density)
pins: 1, 2

## 100pF_0402N_50V_10%_C0G/NP0-DNF
designator C?, comment value (100pF)  Voltage: 50V  Text1: 0402  (hidden comment: 100pF_C0402_50V_10%_C0G/NP0-DNF)
Cap Ceramic C0G/NP0 - Do not Fit; Manufacturer: Various; Part Number: DNF - 100pF 0402 50V 10% C0G/NP0; EDM-PN: CAP802; Tol: 10%; Package: CAPC0402X60N; Text2: *; SAAB PN: *; DCE Part No: *
footprint CAPC0402X60N (Chip Capacitor, 0402, 2-Leads, Body 1.0x0.5mm, IPC Medium Density)
pins: 1, 2

## 100pF_0402N_50V_10%_X7R
designator C?, comment value 100pF  Voltage: 50V  Text1: 0402  (hidden comment: 100pF_C0402_50V_10%_X7R)
Cap Ceramic X7R; Manufacturer: Various; Part Number: 100pF 0402 50V 10% X7R; EDM-PN: CAP929; Tol: 10%; Package: CAPC0402X60N; Text2: *; SAAB PN: *; DCE Part No: *
footprint CAPC0402X60N (Chip Capacitor, 0402, 2-Leads, Body 1.0x0.5mm, IPC Medium Density)
pins: 1, 2

## 100pF_0402N_50V_20%_NP0-X2Y
designator C?, comment value 100pF  Voltage: 50V  Text1: 0402  (hidden comment: X2Y-100pF_C0402_50V_20%_NP0)
Cap Ceramic X2Y; Manufacturer: Johanson; Part Number: 500X07N101MV4T; Tol: 20%; Package: CAPC0402-X2Y; EDM-PN: *; Text2: *; SAAB PN: *; DCE Part No: *
footprint CAPC0402-X2Y (Cap 0402 X2Y 1.1x0.6mm)
pins: A, B, G

## 100pF_0402N_100V_5%_C0G/NP0
designator C?, comment value 100pF  Voltage: 100V  Text1: 0402  (hidden comment: 100pF_C0402_100V_5%_C0G/NP0)
Cap Ceramic C0G/NP0; Manufacturer: Various; Part Number: 100pF 0402 100V 5% C0G/NP0; Tol: 5%; Reutech PN: 5910-CA-0488; Package: CAPC0402X60N; EDM-PN: *; Text2: *; SAAB PN: *; DCE Part No: *
footprint CAPC0402X60N (Chip Capacitor, 0402, 2-Leads, Body 1.0x0.5mm, IPC Medium Density)
pins: 1, 2

## 100pF_0603N_50V_5%_C0G/NP0
designator C?, comment value 100pF  Voltage: 50V  Text1: 0603  (hidden comment: 100pF_C0603_50V_5%_C0G/NP0)
Cap Ceramic C0G/NP0; Manufacturer: Various; Part Number: 100pF 0603 50V 5% C0G/NP0; Tol: 5%; Package: CAPC0603X85N; EDM-PN: *; Text2: *; SAAB PN: *; DCE Part No: *
footprint CAPC0603X85N (Chip Capacitor, 0603, 2-Leads, Body 1.6x0.8mm, IPC Medium Density)
pins: 1, 2